# Altium footprint library OltestLib.PcbLib: 139 footprints (part 1 of 9)
Each footprint in its own frame and in the unit in brackets; x right, y up, seen from the top. Pads: shape width x height; smd on the part's side, far side on the other; paste and mask are expansions set on the pad; w line width, h text height; cw(c..) or ccw(c..) is an arc to the next point about the centre after c.
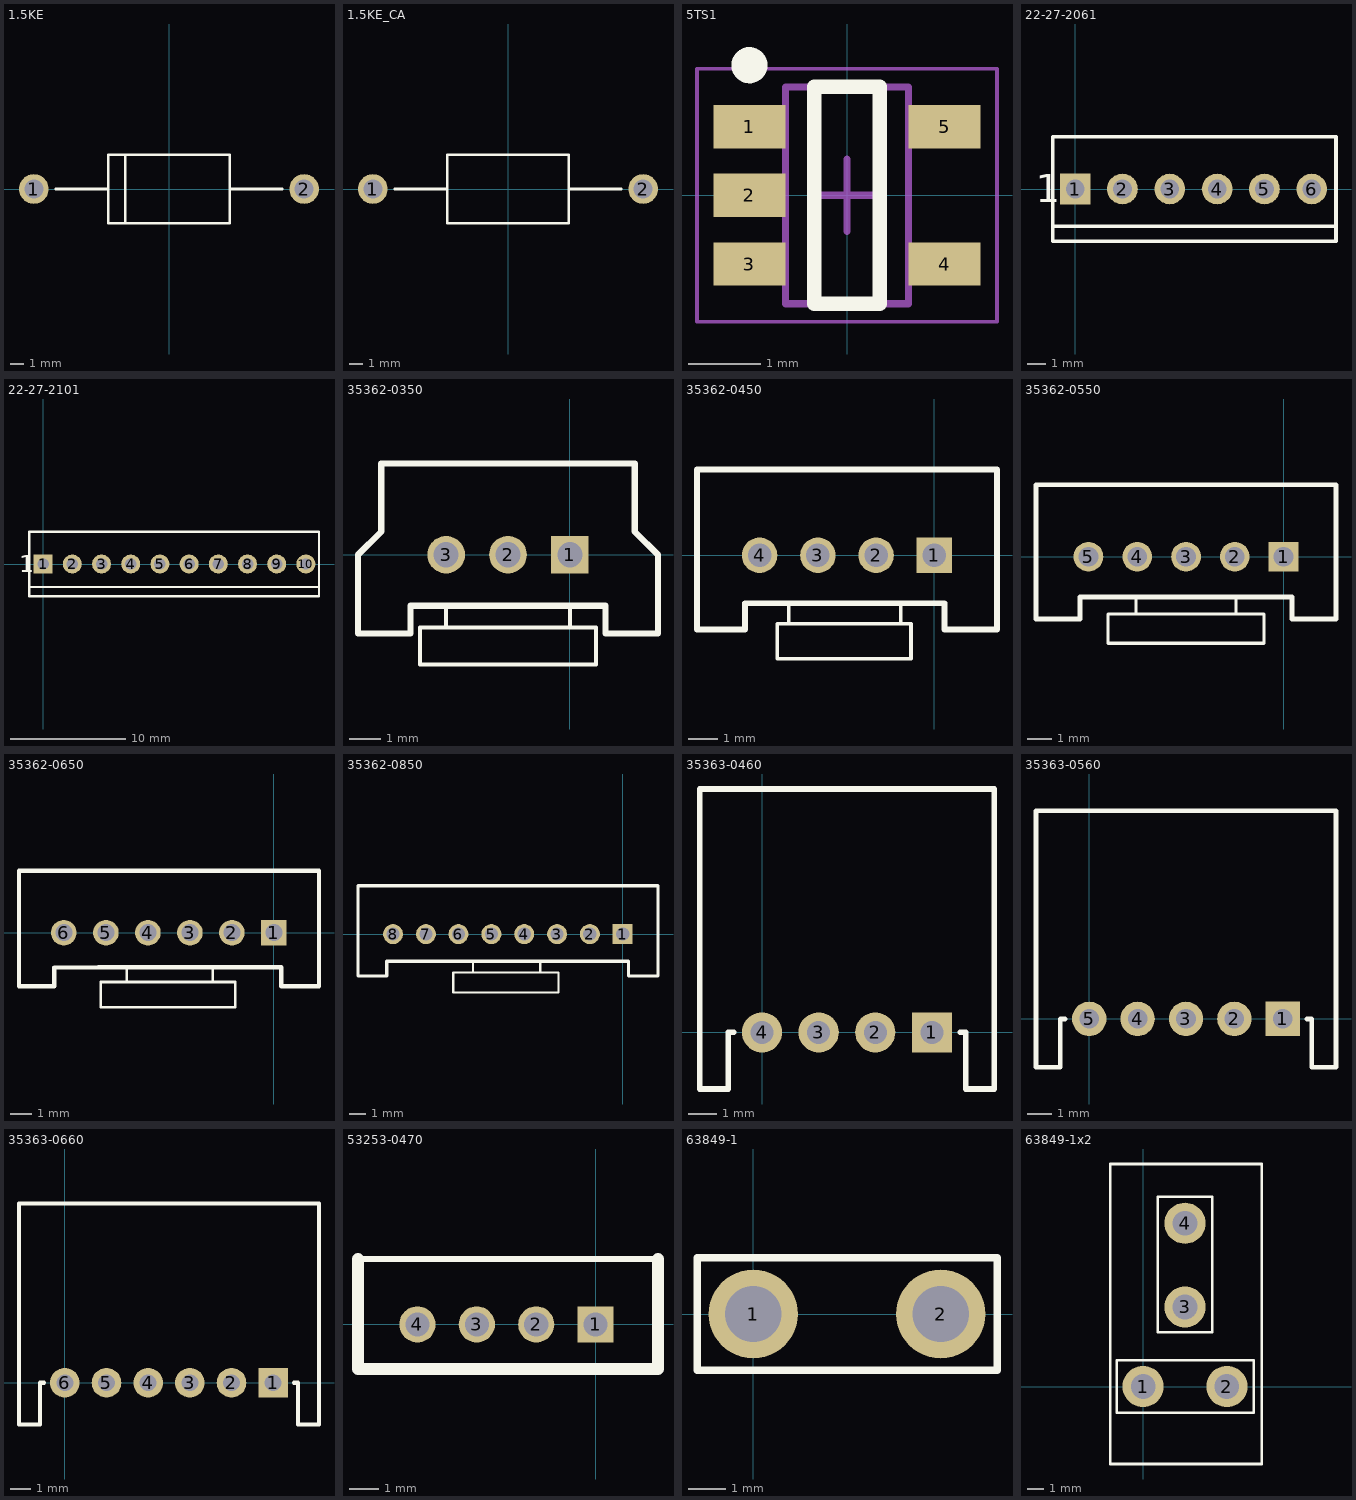
[diagram p0: the footprints below, top view; thin cyan lines are the x and y axes]

## 1.5KE [mm] "AXIAL, 2-Leads, Diameter 5.05mm"
height 7
pads (2):
  round 2.2 hole 1.4: 1(-10,0) 2(10,0)
Top Overlay:
  lines w0.2: -8.382,0 -4.5,0 ; -3.23,-2.525 -3.23,2.525 ; 4.5,0 8.382,0 ; -4.5,-2.525 -4.5,2.525 4.5,2.525 4.5,-2.525 -4.5,-2.525
3D body "do-201ad.STEP": height 6.55, standoff -2.5, extent -10.55,-2.55 10.55,2.55

## 1.5KE_CA [mm] "AXIAL, 2-Leads, Diameter 5.05mm"
height 7
pads (2):
  round 2.2 hole 1.4: 1(-10,0) 2(10,0)
Top Overlay:
  lines w0.2: -8.382,0 -4.5,0 ; 4.5,0 8.382,0 ; -4.5,-2.525 -4.5,2.525 4.5,2.525 4.5,-2.525 -4.5,-2.525
3D body "do-201ad.STEP": height 6.55, standoff -2.5, extent -10.55,-2.55 10.55,2.55

## 5TS1 [mm] "SOT23, 5-Leads, Body 2,90x2,80mm, Pitch 0,95mm, IPC Medium Density"
height 1
pads (5):
  rect 1x0.6 smd: 1(-1.35,0.95) 2(-1.35,0) 3(-1.35,-0.95) 4(1.35,-0.95) 5(1.35,0.95)
Top Overlay:
  circle w0.25: c-1.35,1.8 r0.125
  lines w0.2: -0.45,-1.5 0.45,-1.5 0.45,1.5 -0.45,1.5 -0.45,-1.5
Mechanical 13:
  lines w0.1: -0.85,-1.5 -0.85,1.5 0.85,1.5 0.85,-1.5 -0.85,-1.5
Mechanical 15:
  lines w0.05: -2.075,-1.75 -2.075,1.75 2.075,1.75 2.075,-1.75 -2.075,-1.75
  lines w0.1: -0.5,0 0.5,0 ; 0,-0.5 0,0.5
3D body: height 1, standoff 0.05, extent -0.85,-1.5 0.85,1.5

## 22-27-2061 [mm] "Connector; 6 Position; Vertical; Pitch 2.54 mm; Body 15.2 x 5.7 x 11.6 mm (LxWxH)"
height 11.6
pads (6):
  rect 1.65x1.65 hole 1: 1(0,0)
  round 1.65 hole 1: 2(2.54,0) 3(5.08,0) 4(7.62,0) 5(10.16,0) 6(12.7,0)
Top Overlay:
  lines w0.2: -1.2,-2 14,-2 ; -1.2,-2.8 -1.2,2.8 14,2.8 14,-2.8 -1.2,-2.8
  text "1" at -2.1,-0.7 h1.5
3D body "022272061.stp": height 11.72, standoff -3.54, extent -1.27,-2.9 13.97,2.9

## 22-27-2101 [mm] "Connector; 10 Position; Vertical; Pitch 2.54 mm; Body 25 x 5.7 x 11.6 mm (LxWxH)"
height 11.6
pads (10):
  rect 1.65x1.65 hole 1: 1(0,0)
  round 1.65 hole 1: 2(2.54,0) 3(5.08,0) 4(7.62,0) 5(10.16,0) 6(12.7,0) 7(15.24,0) 8(17.78,0) 9(20.32,0) 10(22.86,0)
Top Overlay:
  lines w0.2: -1.2,-2 24,-2 ; -1.2,-2.8 24,-2.8 24,2.8 -1.2,2.8 -1.2,-2.8
  text "1" at -2.1,-0.7 h1.5
3D body "022272101.stp": height 12.12, standoff -3.14, extent -1.275,-2.9 24.125,2.9

## 35362-0350 [mil]
pads (3):
  rect 48x48 / inner round 0 / far side rect 48x48 hole 32 mask+4.97: 1(0,0)
  round 48 / inner round 0 / far side round 48 hole 32 mask+4.97: 2(-78.73,0) 3(-157.47,0)
Top Overlay:
  lines w5: -157.47,-64.95 -157.47,-92.52 0,-92.52 0,-64.95 ; -190.93,-139.75 -190.93,-92.52 33.45,-92.52 33.45,-139.75 -190.93,-139.75
  lines w7.87: -157.47,-64.95 0,-64.95 ; -269.68,-100.38 -202.75,-100.38 -202.75,-64.95 45.27,-64.95 45.27,-100.38 112.2,-100.38 112.2,0 82.67,29.52 82.67,116.13 -240.15,116.13 -240.15,29.52 -269.68,0 -269.68,-100.38
3D body "353620350.stp": height 335.32, standoff -129.24, extent -269.94,-103.23 111.95,115.27

## 35362-0450 [mil]
pads (4):
  rect 48x48 / inner round 0 / far side rect 48x48 hole 32 mask+4.97: 1(0,0)
  round 48 / inner round 0 / far side round 48 hole 32 mask+4.97: 2(-78.73,0) 3(-157.47,0) 4(-236.22,0)
Top Overlay:
  lines w5: -212.58,-139.75 -31.48,-139.75 -31.48,-92.52 -212.58,-92.52 -212.58,-139.75 ; -196.85,-92.52 -196.85,-64.95 -45.27,-64.95 -45.27,-92.52 -196.85,-92.52
  lines w7.87: -320.85,-100.38 -320.85,116.13 84.63,116.13 84.63,-100.38 13.77,-100.38 13.77,-64.95 -255.9,-64.95 -255.9,-100.38 -320.85,-100.38
3D body "353620450.stp": height 335.32, standoff -129.24, extent -320.75,-102.23 84.76,116.28

## 35362-0550 [mil]
pads (5):
  rect 48x48 / inner round 0 / far side rect 48x48 hole 32 mask+4.97: 1(0,0)
  round 48 / inner round 0 / far side round 48 hole 32 mask+4.97: 2(-78.73,0) 3(-157.47,0) 4(-236.22,0) 5(-314.95,0)
Top Overlay:
  lines w5: -283.45,-139.75 -31.48,-139.75 -31.48,-92.52 -283.45,-92.52 -283.45,-139.75 ; -238.18,-92.52 -238.18,-64.95 -76.77,-64.95 -76.77,-92.52 -238.18,-92.52
  lines w7.87: -399.6,-100.38 -328.73,-100.38 -328.73,-64.95 13.77,-64.95 13.77,-100.38 84.63,-100.38 84.63,116.13 -399.6,116.13 -399.6,-100.38
3D body "353620550.stp": height 335.32, standoff -129.24, extent -399.12,-102.23 85.13,116.28

## 35362-0650 [mil]
pads (6):
  rect 48x48 / inner round 0 / far side rect 48x48 hole 32 mask+4.97: 1(0,0)
  round 48 / inner round 0 / far side round 48 hole 32 mask+4.97: 2(-78.73,0) 3(-157.47,0) 4(-236.22,0) 5(-314.95,0) 6(-394,0)
Top Overlay:
  lines w5: -324.45,-139.75 -72.48,-139.75 -72.48,-92.52 -324.45,-92.52 -324.45,-139.75 ; -276.18,-92.52 -114.77,-92.52 -114.77,-64.95 -276.18,-64.95 -276.18,-92.52
  lines w7.87: -478,-100.38 -478,116.13 84.63,116.13 84.63,-100.38 13.77,-100.38 13.77,-64.95 -328.73,-64.95 -412,-65 -412,-100.38 -478,-100.38
3D body "353620650.stp": height 335.32, standoff -129.24, extent -478.49,-102.23 84.5,116.28

## 35362-0850 [mil]
pads (8):
  rect 48x48 / inner round 0 / far side rect 48x48 hole 32 mask+4.97: 1(0,0)
  round 48 / inner round 0 / far side round 48 hole 32 mask+4.97: 2(-78.73,0) 3(-157.47,0) 4(-236.22,0) 5(-314.95,0) 6(-394,0) 7(-472,0) 8(-551,0)
Top Overlay:
  lines w5: -406.45,-139.75 -406.45,-92.52 -154.48,-92.52 -154.48,-139.75 -406.45,-139.75 ; -359.18,-92.52 -359.18,-64.95 -197.77,-64.95 -197.77,-92.52 -359.18,-92.52
  lines w7.87: -635,-100.38 -635,116 -399.6,116.13 84.63,116.13 84.63,-100.38 13.77,-100.38 13.77,-64.95 -328.73,-64.95 -566,-65 -566,-100.38 -635,-100.38

## 35363-0460 [mil]
pads (4):
  rect 56x56 / inner round 0 / far side rect 56x56 hole 32 mask+4.97: 1(236.22,0)
  round 56 / inner round 0 / far side round 56 hole 32 mask+4.97: 2(157.47,0) 3(78.73,0) 4(0,0)
Top Overlay:
  lines w7.87: -39.37,0 -47.23,0 -47.23,-78.73 -86.6,-78.73 -86.6,338.57 0,338.57 236.2,338.57 ; 236.23,338.57 322.85,338.57 322.85,-78.73 283.48,-78.73 283.48,0 275.62,0

## 35363-0560 [mil]
pads (5):
  rect 56x56 / inner round 0 / far side rect 56x56 hole 32 mask+4.97: 1(314.95,0)
  round 56 / inner round 0 / far side round 56 hole 32 mask+4.97: 2(236.22,0) 3(157.47,0) 4(78.73,0) 5(0,0)
Top Overlay:
  lines w7.87: -39.37,0 -47.23,0 -47.23,-78.73 -86.6,-78.73 -86.6,338.57 0,338.57 314.93,338.57 401.58,338.57 401.58,-78.73 362.22,-78.73 362.22,0 354.35,0
3D body "353630560.stp": height 217.27, standoff -125.25, extent -84.12,-77.06 400.13,336.33

## 35363-0660 [mil]
pads (6):
  rect 56x56 / inner round 0 / far side rect 56x56 hole 32 mask+4.97: 1(393.7,0)
  round 56 / inner round 0 / far side round 56 hole 32 mask+4.97: 2(314.95,0) 3(236.22,0) 4(157.47,0) 5(78.73,0) 6(0,0)
Top Overlay:
  lines w7.87: -39.37,0 -47.23,0 -47.23,-78.73 -86.6,-78.73 -86.6,338.57 0,338.57 393.7,338.57 480.32,338.57 480.32,-78.73 440.95,-78.73 440.95,0 433.08,0

## 53253-0470 [mil]
pads (4):
  rect 48x48 / inner round 0 / far side rect 48x48 hole 32 mask+4.97: 1(0,0)
  round 48 / inner round 0 / far side round 48 hole 32 mask+4.97: 2(-78.73,0) 3(-157.47,0) 4(-236.22,0)
Top Overlay:
  lines w7.87: -314.96,86.61 82.68,86.61
  lines w15.75: -314.96,86.61 -314.96,-59.06 82.68,-59.06 82.68,86.61
3D body "532530470.stp": height 217.04, standoff -97.93, extent -314.95,-59.05 78.75,84.65

## 63849-1 [mil]
height 400
pads (2):
  round 95 hole 60: 1(0,0) 2(200,0)
Top Overlay:
  lines w8: -60,-60 260,-60 260,60 -60,60 -60,-60
3D body "c-154718-3-as-3d.stp": height 913.98, standoff 38.06, extent -46.55,-98.43 243.4,113.8
3D body "c-154719-1-av-3d.stp": height 955.12, standoff 0, extent -106.1,-140.79 278.54,142.28
3D body "c-63849-1-k-3d.stp": height 409, standoff -143, extent -56,-60 256,61.5

## 63849-1x2 [mm]
pads (4):
  round 2.5 hole 1.5: 1(0,0) 2(5.08,0) 3(2.54,4.826) 4(2.54,9.906)
Top Overlay:
  lines w0.152: -2,-4.7 7.2,-4.7 7.2,13.5 -2,13.5 -2,-4.7 ; -1.6,-1.6 -1.6,1.6 6.7,1.6 6.7,-1.6 -1.6,-1.6 ; 0.9,3.3 0.9,11.5 4.2,11.5 4.2,3.3 0.9,3.3
3D body "c-154717-3-at-3d.stp": height 23.31, standoff 1.07, extent -1.143,-2.555 6.222,3.195
3D body "c-154717-3-at-3d.stp": height 23.31, standoff 1.07, extent -0.655,3.654 5.095,11.019
3D body "c-63849-1-k-3d.stp": height 10.22, standoff -3.8, extent -1.422,-1.543 6.503,1.543
3D body "c-63849-1-k-3d.stp": height 10.21, standoff -3.81, extent 0.997,3.404 4.083,11.328
3D body "c-0926522-02-r-3d.stp": height 25.03, standoff 0.9, extent -1.96,-4.705 7.19,13.445